# Altium footprint library Cty1.PcbLib: 1378 footprints (part 74 of 87)
Each footprint in its own frame and in the unit in brackets; x right, y up, seen from the top. Pads: shape width x height; smd on the part's side, far side on the other; paste and mask are expansions set on the pad; w line width, h text height; cw(c..) or ccw(c..) is an arc to the next point about the centre after c.
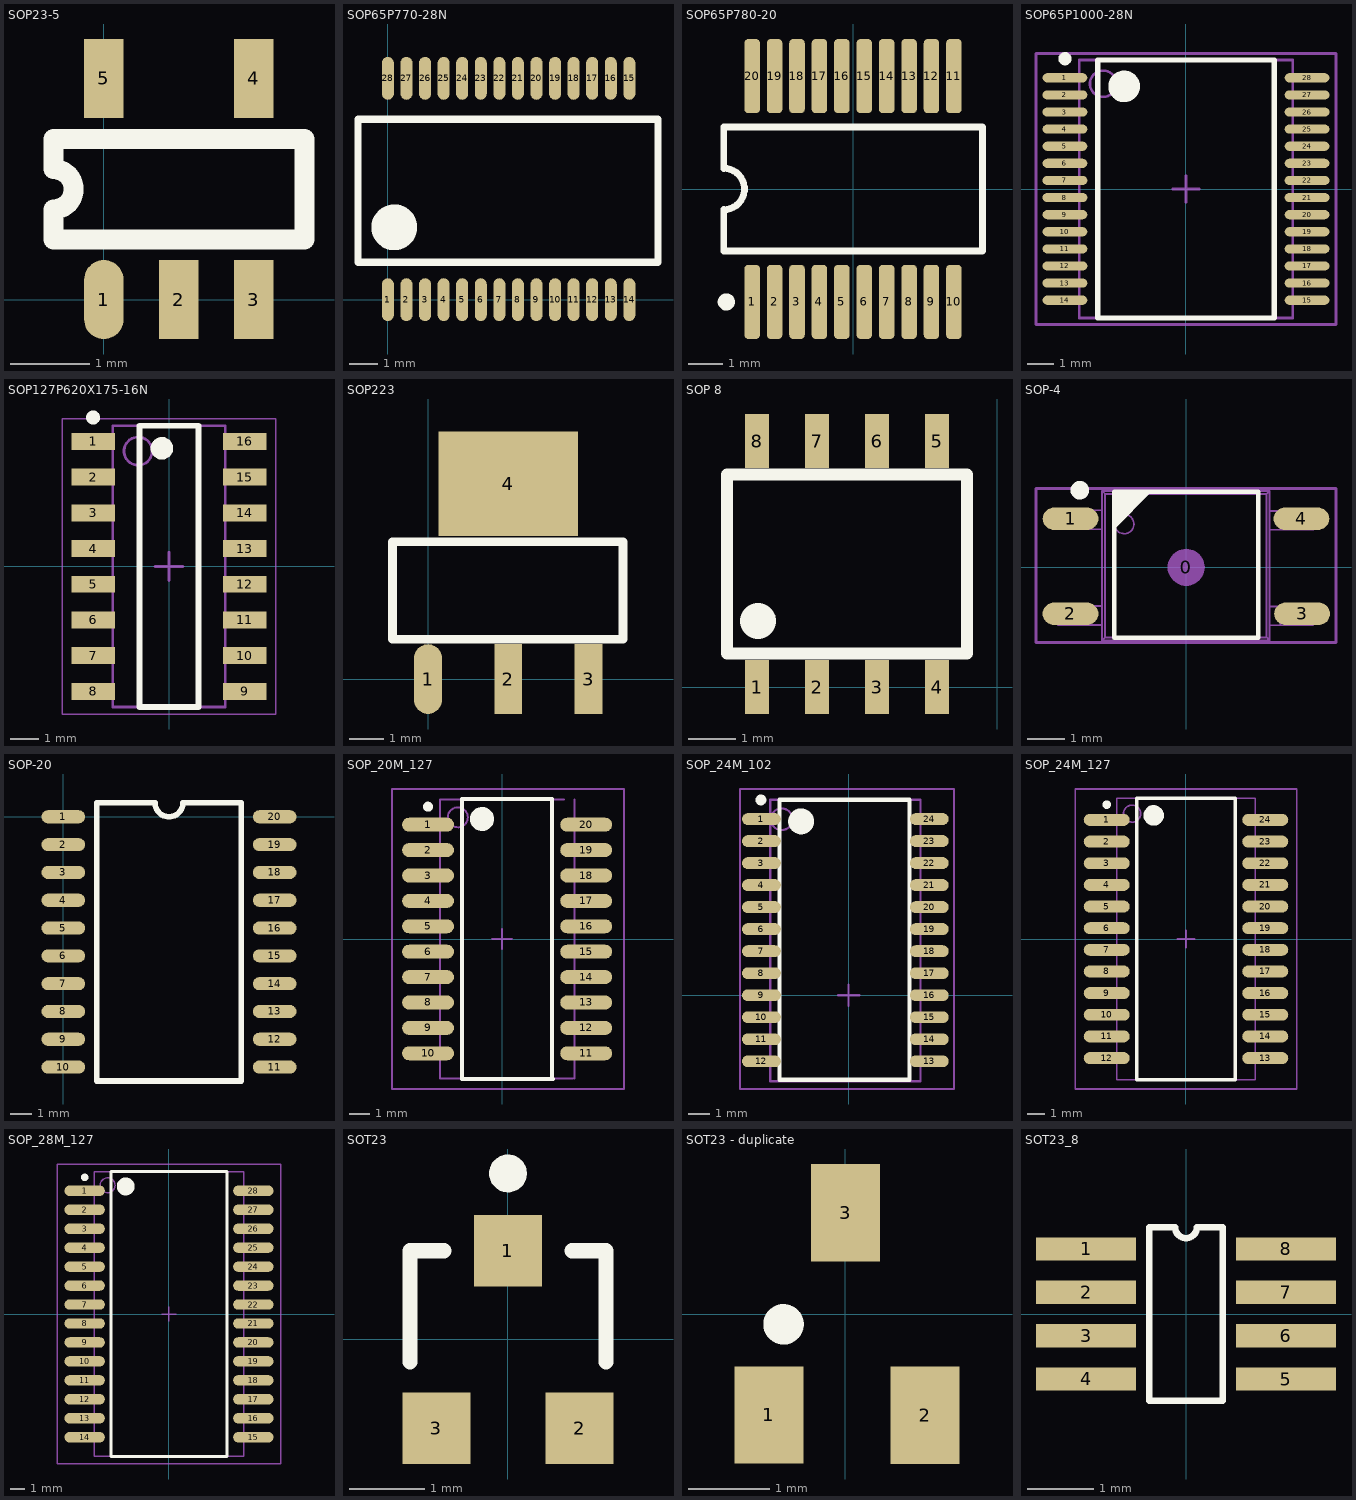
[diagram p73: the footprints below, top view; thin cyan lines are the x and y axes]

## SOP23-5 [mm]
pads (5):
  oval 0.5x1 smd: 1(0,0)
  rect 0.5x1 smd: 2(0.95,0) 3(1.9,0) 4(1.9,2.8) 5(0,2.8)
Top Overlay:
  lines w0.254: -0.635,0.762 2.54,0.762 2.54,2.032 -0.635,2.032 -0.635,1.651 cw(c-0.635,1.397) -0.635,1.143 -0.635,0.762

## SOP65P770-28N [mil]
pads (28):
  oval 16.53x59.03 smd mask+7.9: 1(0,0) 2(25.6,0) 3(51.18,0) 4(76.78,0) 5(102.37,0) 6(127.97,0) 7(153.57,0) 8(179.15,0) 9(204.75,0) 10(230.35,0) 11(255.93,0) 12(281.53,0) 13(307.12,0) 14(332.7,0) 15(332.7,305) 16(307.12,305) 17(281.53,305) 18(255.93,305) 19(230.35,305) 20(204.75,305) 21(179.15,305) 22(153.57,305) 23(127.97,305) 24(102.37,305) 25(76.78,305) 26(51.18,305) 27(25.6,305) 28(0,305)
Top Overlay:
  circle w39.37: c8.8,99.7 r11.88
  lines w10: -41.22,51.66 -41.22,248.53 372.21,248.53 372.21,51.66 -41.22,51.66
3D body "SOP65P770x200-28N.step": height 84.65, standoff 0, extent -37.01,0.01 369.69,305.35

## SOP65P780-20 [mm]
pads (20):
  rrect50% 0.45x2.15 smd: 1(-2.925,-3.275) 2(-2.275,-3.275) 3(-1.625,-3.275) 4(-0.975,-3.275) 5(-0.325,-3.275) 6(0.325,-3.275) 7(0.975,-3.275) 8(1.625,-3.275) 9(2.275,-3.275) 10(2.925,-3.275) 11(2.925,3.275) 12(2.275,3.275) 13(1.625,3.275) 14(0.975,3.275) 15(0.325,3.275) 16(-0.325,3.275) 17(-0.975,3.275) 18(-1.625,3.275) 19(-2.275,3.275) 20(-2.925,3.275)
Top Overlay:
  circle w0.25: c-3.675,-3.275 r0.125
  lines w0.2: -3.75,-1.8 -3.75,-0.6 ccw(c-3.75,0) -3.75,0.6 -3.75,1.8 3.75,1.8 3.75,-1.8 -3.75,-1.8
3D body: height 1, standoff 0, extent -3.278,-1.757 3.378,1.807
3D body: height 0.25, standoff 0.13, extent 2.849,1.894 3.027,2.631
3D body: height 0.13, standoff 0, extent 2.849,2.567 3.027,3.253
3D body: height 0.25, standoff 0.13, extent 2.189,1.919 2.367,2.656
3D body: height 0.13, standoff 0, extent 2.189,2.592 2.367,3.278
3D body: height 0.13, standoff 0, extent 2.85,-3.326 3.028,-2.641
3D body: height 0.25, standoff 0.13, extent 2.85,-2.679 3.028,-1.942
3D body: height 0.13, standoff 0, extent 2.215,-3.301 2.393,-2.615
3D body: height 0.25, standoff 0.13, extent 2.215,-2.679 2.393,-1.942
3D body: height 0.25, standoff 0.13, extent 1.478,1.843 1.656,2.58
3D body: height 0.13, standoff 0, extent 1.478,2.516 1.656,3.202
3D body: height 0.25, standoff 0.13, extent 0.843,1.843 1.021,2.58
3D body: height 0.13, standoff 0, extent 0.843,2.542 1.021,3.227
3D body: height 0.25, standoff 0.13, extent 0.182,1.869 0.36,2.605
3D body: height 0.13, standoff 0, extent 0.182,2.542 0.36,3.227
3D body: height 0.25, standoff 0.13, extent -0.478,1.894 -0.3,2.631
3D body: height 0.13, standoff 0, extent -0.478,2.567 -0.3,3.253
3D body: height 0.13, standoff 0, extent 1.529,-3.25 1.707,-2.564
3D body: height 0.25, standoff 0.13, extent 1.529,-2.628 1.707,-1.891
3D body: height 0.13, standoff 0, extent 0.869,-3.225 1.047,-2.539
3D body: height 0.25, standoff 0.13, extent 0.869,-2.602 1.047,-1.866
3D body: height 0.13, standoff 0, extent 0.209,-3.225 0.386,-2.539
3D body: height 0.25, standoff 0.13, extent 0.209,-2.577 0.386,-1.84
3D body: height 0.13, standoff 0, extent -0.426,-3.199 -0.249,-2.514
3D body: height 0.25, standoff 0.13, extent -0.426,-2.577 -0.249,-1.84
3D body: height 0.25, standoff 0.13, extent -2.966,-2.577 -2.789,-1.84
3D body: height 0.13, standoff 0, extent -2.966,-3.199 -2.789,-2.514
3D body: height 0.25, standoff 0.13, extent -2.331,-2.577 -2.154,-1.84
3D body: height 0.13, standoff 0, extent -2.331,-3.225 -2.154,-2.539
3D body: height 0.25, standoff 0.13, extent -1.671,-2.602 -1.493,-1.866
3D body: height 0.13, standoff 0, extent -1.671,-3.225 -1.493,-2.539
3D body: height 0.25, standoff 0.13, extent -1.011,-2.628 -0.833,-1.891
3D body: height 0.13, standoff 0, extent -1.011,-3.25 -0.833,-2.564
3D body: height 0.13, standoff 0, extent -3.018,2.567 -2.84,3.253
3D body: height 0.25, standoff 0.13, extent -3.018,1.894 -2.84,2.631
3D body: height 0.13, standoff 0, extent -2.358,2.542 -2.18,3.227
3D body: height 0.25, standoff 0.13, extent -2.358,1.869 -2.18,2.605
3D body: height 0.13, standoff 0, extent -1.697,2.542 -1.519,3.227
3D body: height 0.25, standoff 0.13, extent -1.697,1.843 -1.519,2.58
3D body: height 0.13, standoff 0, extent -1.062,2.516 -0.884,3.202
3D body: height 0.25, standoff 0.13, extent -1.062,1.843 -0.884,2.58
3D body: height 0.9, standoff 0, extent -3.327,-2.008 3.429,2.007

## SOP65P1000-28N [mm] "SOP, 28-Leads, Body 9.7x8mm, Pitch 0.65mm, IPC Medium Density"
height 2
pads (28):
  oval 1.7x0.35 smd: 1(-4.6,4.225) 2(-4.6,3.575) 3(-4.6,2.925) 4(-4.6,2.275) 5(-4.6,1.625) 6(-4.6,0.975) 7(-4.6,0.325) 8(-4.6,-0.325) 9(-4.6,-0.975) 10(-4.6,-1.625) 11(-4.6,-2.275) 12(-4.6,-2.925) 13(-4.6,-3.575) 14(-4.6,-4.225) 15(4.6,-4.225) 16(4.6,-3.575) 17(4.6,-2.925) 18(4.6,-2.275) 19(4.6,-1.625) 20(4.6,-0.975) 21(4.6,-0.325) 22(4.6,0.325) 23(4.6,0.975) 24(4.6,1.625) 25(4.6,2.275) 26(4.6,2.925) 27(4.6,3.575) 28(4.6,4.225)
Top Overlay:
  circle w0.6: c-2.35,3.9 r0.3
  circle w0.25: c-4.6,4.95 r0.125
  lines w0.2: -3.35,-4.9 3.35,-4.9 3.35,4.9 -3.35,4.9 -3.35,-4.9
Mechanical 13:
  circle w0.1: c-3.15,4 r0.5
  lines w0.1: -4.05,-4.9 4.05,-4.9 4.05,4.9 -4.05,4.9 -4.05,-4.9
Mechanical 15:
  lines w0.1: -0.5,0 0.5,0 ; 0,-0.5 0,0.5 ; -5.7,-5.15 5.7,-5.15 5.7,5.15 -5.7,5.15 -5.7,-5.15
3D body: height 2, standoff 0, extent -4.05,-4.9 4.05,4.9

## SOP127P620X175-16N [mm] "SOP, 16-Leads, Body 10.00x4.00mm, Pitch 1.27mm, IPC Medium Density"
height 1.75
pads (16):
  rect 1.55x0.6 smd: 1(-2.7,4.445) 2(-2.7,3.175) 3(-2.7,1.905) 4(-2.7,0.635) 5(-2.7,-0.635) 6(-2.7,-1.905) 7(-2.7,-3.175) 8(-2.7,-4.445) 9(2.7,-4.445) 10(2.7,-3.175) 11(2.7,-1.905) 12(2.7,-0.635) 13(2.7,0.635) 14(2.7,1.905) 15(2.7,3.175) 16(2.7,4.445)
Top Overlay:
  circle w0.4: c-0.25,4.2 r0.2
  circle w0.25: c-2.7,5.295 r0.125
  lines w0.2: -1.05,-5 1.05,-5 1.05,5 -1.05,5 -1.05,-5
Mechanical 13:
  circle w0.1: c-1.1,4.1 r0.5
  lines w0.1: -2,-5 2,-5 2,5 -2,5 -2,-5
Mechanical 15:
  lines w0.05: -3.8,-5.25 3.8,-5.25 3.8,5.25 -3.8,5.25 -3.8,-5.25
  lines w0.1: -0.5,0 0.5,0 ; 0,-0.5 0,0.5
3D body: height 1.75, standoff 0.25, extent -2,-5 2,5

## SOP223 [mm]
pads (4):
  oval 0.8x2 smd: 1(0,0)
  rect 0.8x2 smd: 2(2.3,0) 3(4.6,0)
  rect 4x3 smd: 4(2.3,5.6)
Top Overlay:
  lines w0.254: -1.016,1.143 -1.016,3.937 5.588,3.937 5.588,1.143 -1.016,1.143

## SOP 8 [mil]
pads (8):
  rect 20x45 smd: 1(-200,0) 2(-150,0) 3(-100,0) 4(-50,0) 5(-50,205) 6(-100,205) 7(-150,205) 8(-200,205)
Top Overlay:
  lines w10: -225,28 -25,28 -25,177 -225,177 -225,28
  lines w30: -199.03,55.09 cw(c-203.05,53.75) -199,55

## SOP-4 [mm] "SOP, 0.65mm pitch, 8 pin, Body 3.0x3.0x1.09mm LWH, IPC Medium Density"
height 1.09
pads (5):
  round 1 on Mech15: 0(-0.005,-0.005)
  oval 1.5x0.6 smd: 1(-3.112,1.301) 2(-3.116,-1.254) 3(3.112,-1.254) 4(3.093,1.301)
Top Overlay:
  circle w0.25: c-2.864,2.068 r0.125
  region: -1.938,2.025 -0.938,2.025 -1.938,1.025
  lines w0.127: -1.938,-1.901 1.935,-1.901 1.935,2.025 -1.938,2.025 -1.938,-1.901
Mechanical 13:
  circle w0.05: c-1.671,1.158 r0.26
  lines w0.05: -3.113,-1.536 -3.112,-1.051 ; -3.103,1.039 -3.102,1.524 ; -3.025,-1.555 -3.024,-1.055 ; -3.015,1.02 -3.014,1.521 ; -2.95,-1.543 -2.95,-1.069 ; -2.94,1.032 -2.94,1.507 ; -2.57,-1.549 -2.57,-1.059 ; -2.56,1.026 -2.56,1.516 ; -2.281,-1.555 -3.448,-1.555 -3.448,-1.047 -2.281,-1.047 ; -2.273,-1.975 2.234,-1.975 ; -2.271,1.02 -3.438,1.02 -3.438,1.528 -2.271,1.528 ; -2.271,2.046 -2.271,-1.972 ; -2.184,-1.894 -2.184,1.959 ; 2.132,1.962 -2.174,1.962 -2.261,2.05 2.237,2.05 ; 2.145,-1.888 -2.186,-1.888 -2.271,-1.973 ; 2.145,-1.877 2.232,-1.964 ; 2.151,-1.886 2.151,1.962 2.238,2.049 2.238,-1.977 ; 2.244,-1.564 3.411,-1.564 3.411,-1.056 2.244,-1.056 ; 2.259,1.005 3.426,1.005 3.426,1.513 2.259,1.513 ; 2.533,-1.552 2.533,-1.062 ; 2.548,1.017 2.548,1.506 ; 2.913,-1.543 2.913,-1.068 ; 2.928,1.026 2.928,1.501 ; 2.986,-1.557 2.988,-1.056 ; 3.001,1.012 3.003,1.513 ; 3.074,-1.56 3.076,-1.075 ; 3.089,1.009 3.091,1.493 ; -2.271,-1.972 -2.271,-1.973
Mechanical 15:
  lines w0.076: -4.043,-2.024 -4.043,2.113 4.023,2.113 4.023,-2.024 -4.043,-2.024
3D body "SOP-4.step": height 2.06, standoff 0.01, extent -3.396,-1.978 3.464,2.022

## SOP-20 [mm]
pads (20):
  oval 2x0.6 smd: 1(0,0) 2(0,-1.27) 3(0,-2.54) 4(0,-3.81) 5(0,-5.08) 6(0,-6.35) 7(0,-7.62) 8(0,-8.89) 9(0,-10.16) 10(0,-11.43) 11(9.652,-11.43) 12(9.652,-10.16) 13(9.652,-8.89) 14(9.652,-7.62) 15(9.652,-6.35) 16(9.652,-5.08) 17(9.652,-3.81) 18(9.652,-2.54) 19(9.652,-1.27) 20(9.652,0)
Top Overlay:
  lines w0.254: 1.524,-12.065 1.524,0.635 4.191,0.635 ccw(c4.826,0.635) 5.461,0.635 8.128,0.635 8.128,-12.065 1.524,-12.065

## SOP_20M_127 [mm] "SOP, 20-Leads, Body 13.4x6.2mm, Pitch 1.27mm, IPC Low Density"
height 2
pads (20):
  oval 2.6x0.7 smd: 1(-3.7,5.715) 2(-3.7,4.445) 3(-3.7,3.175) 4(-3.7,1.905) 5(-3.7,0.635) 6(-3.7,-0.635) 7(-3.7,-1.905) 8(-3.7,-3.175) 9(-3.7,-4.445) 10(-3.7,-5.715) 11(4.208,-5.715) 12(4.208,-4.445) 13(4.208,-3.175) 14(4.208,-1.905) 15(4.208,-0.635) 16(4.208,0.635) 17(4.208,1.905) 18(4.208,3.175) 19(4.208,4.445) 20(4.208,5.715)
Top Overlay:
  circle w0.25: c-3.7,6.615 r0.125
  circle w0.6: c-1,6 r0.3
  lines w0.2: 2.413,7 -2,7 -2,-7 2.54,-7 ; 2.508,-7 2.508,7
Mechanical 13:
  circle w0.1: c-2.21,6.085 r0.5
  lines w0.1: 3.11,6.985 -3.11,6.985 -3.11,-6.985 3.556,-6.985 ; 3.618,-6.985 3.618,6.985
Mechanical 15:
  lines w0.1: -0.5,0 0.5,0 ; 0,-0.5 0,0.5 ; -5.5,-7.5 -5.5,7.5 6.096,7.5 6.096,-7.5 -5.5,-7.5
3D body: height 2, standoff 0, extent -3.11,-6.985 3.556,6.985

## SOP_24M_102 [mm] "24-Pin Small Outline Package 1.02 mm Pitch"
height 2.64
pads (24):
  oval 1.8x0.55 smd: 1(-4.039,8.16) 2(-4.039,7.14) 3(-4.039,6.12) 4(-4.039,5.1) 5(-4.039,4.08) 6(-4.039,3.06) 7(-4.039,2.04) 8(-4.039,1.02) 9(-4.039,0) 10(-4.039,-1.02) 11(-4.039,-2.04) 12(-4.039,-3.06) 13(3.734,-3.06) 14(3.734,-2.04) 15(3.734,-1.02) 16(3.734,0) 17(3.734,1.02) 18(3.734,2.04) 19(3.734,3.06) 20(3.734,4.08) 21(3.734,5.1) 22(3.734,6.12) 23(3.734,7.14) 24(3.734,8.16)
Top Overlay:
  circle w0.6: c-2.2,8.05 r0.3
  circle w0.25: c-4.062,9.042 r0.125
  lines w0.2: -3.2,-3.912 2.819,-3.912 2.819,9.05 -3.2,9.05 -3.2,-3.912
Mechanical 13:
  circle w0.1: c-3.1,8.15 r0.5
  lines w0.1: -3.632,-3.988 3.327,-3.988 3.327,9.05 -3.632,9.05 -3.632,-3.988
Mechanical 15:
  lines w0.1: -0.5,0 0.5,0 ; 0,-0.5 0,0.5 ; -5.029,-4.343 4.877,-4.343 4.877,9.55 -5.029,9.55 -5.029,-4.343
3D body: height 2.64, standoff 0, extent -3.632,-3.937 3.353,9.05

## SOP_24M_127 [mm] "SOP, 24-Leads, Body 15.6x8.1mm, Pitch 1.27mm, IPC Low Density"
height 2.5
pads (24):
  oval 2.7x0.7 smd: 1(-4.65,6.985) 2(-4.65,5.715) 3(-4.65,4.445) 4(-4.65,3.175) 5(-4.65,1.905) 6(-4.65,0.635) 7(-4.65,-0.635) 8(-4.65,-1.905) 9(-4.65,-3.175) 10(-4.65,-4.445) 11(-4.65,-5.715) 12(-4.65,-6.985) 13(4.65,-6.985) 14(4.65,-5.715) 15(4.65,-4.445) 16(4.65,-3.175) 17(4.65,-1.905) 18(4.65,-0.635) 19(4.65,0.635) 20(4.65,1.905) 21(4.65,3.175) 22(4.65,4.445) 23(4.65,5.715) 24(4.65,6.985)
Top Overlay:
  circle w0.6: c-1.9,7.25 r0.3
  circle w0.25: c-4.65,7.885 r0.125
  lines w0.2: -2.9,-8.25 2.9,-8.25 2.9,8.25 -2.9,8.25 -2.9,-8.25
Mechanical 13:
  circle w0.1: c-3.165,7.355 r0.5
  lines w0.1: -4.065,-8.255 4.065,-8.255 4.065,8.255 -4.065,8.255 -4.065,-8.255
Mechanical 15:
  lines w0.1: -0.5,0 0.5,0 ; 0,-0.5 0,0.5 ; -6.5,-8.8 6.5,-8.8 6.5,8.8 -6.5,8.8 -6.5,-8.8
3D body: height 2.79, standoff 2.54, extent -0.533,7.188 0.61,7.696
3D body: height 2.79, standoff 0.25, extent -2.649,6.324 -1.785,7.111
3D body "SW3dPS-24 pin soic.STEP": height 2.7, standoff -0.11, extent -4.949,-7.853 5.051,7.747

## SOP_28M_127 [mm] "SOP, 28-Leads, Body 18.1x8.6mm, Pitch 1.27mm, IPC Low Density"
height 3.05
pads (28):
  oval 2.7x0.7 smd: 1(-5.65,8.255) 2(-5.65,6.985) 3(-5.65,5.715) 4(-5.65,4.445) 5(-5.65,3.175) 6(-5.65,1.905) 7(-5.65,0.635) 8(-5.65,-0.635) 9(-5.65,-1.905) 10(-5.65,-3.175) 11(-5.65,-4.445) 12(-5.65,-5.715) 13(-5.65,-6.985) 14(-5.65,-8.255) 15(5.65,-8.255) 16(5.65,-6.985) 17(5.65,-5.715) 18(5.65,-4.445) 19(5.65,-3.175) 20(5.65,-1.905) 21(5.65,-0.635) 22(5.65,0.635) 23(5.65,1.905) 24(5.65,3.175) 25(5.65,4.445) 26(5.65,5.715) 27(5.65,6.985) 28(5.65,8.255)
Top Overlay:
  circle w0.25: c-5.65,9.155 r0.125
  circle w0.6: c-2.9,8.55 r0.3
  lines w0.2: -3.9,-9.55 -3.9,9.55 3.9,9.55 3.9,-9.55 -3.9,-9.55
Mechanical 13:
  circle w0.1: c-4.115,8.625 r0.5
  lines w0.1: -5.015,-9.525 -5.015,9.525 5.015,9.525 5.015,-9.525 -5.015,-9.525
Mechanical 15:
  lines w0.1: -0.5,0 0.5,0 ; 0,-0.5 0,0.5 ; -7.5,-10.05 -7.5,10.05 7.5,10.05 7.5,-10.05 -7.5,-10.05
3D body "SO28.STEP": height 2.64, standoff 0, extent -5.336,-9.04 5.334,9.04

## SOT23 [mm] "SOT-23; 3 Leads; Body 3.1 x 2.5 mm, inc. leads (LxW max), Alternate Lead Configuration"
height 1.1
pads (3):
  rect 0.9x0.95 smd: 1(0,1.175) 2(0.95,-1.175) 3(-0.95,-1.175)
Top Overlay:
  circle w0.25: c0,2.2 r0.125
  lines w0.2: -1.3,-0.3 -1.3,1.175 -0.85,1.175 ; 0.85,1.175 1.3,1.175 1.3,-0.3

## SOT23 - duplicate [mm] "SOT 23 _ 1-3-2"
height 1.27
pads (3):
  rect 0.85x1.2 smd: 1(-0.94,-1.245) 2(0.985,-1.25) 3(0.005,1.25)
Top Overlay:
  circle w0.25: c-0.76,-0.127 r0.125
3D body "SW3DPS-SOT-23-DEFAULT.STEP": height 1.06, standoff -0.04, extent -1.475,-1.326 1.525,1.174

## SOT23_8 [mm]
pads (8):
  rect 1.5x0.35 smd: 1(-1.5,0.975) 2(-1.5,0.325) 3(-1.5,-0.325) 4(-1.5,-0.975) 5(1.5,-0.975) 6(1.5,-0.325) 7(1.5,0.325) 8(1.5,0.975)
Top Overlay:
  lines w0.1: -0.553,-1.3 0.553,-1.3 0.553,1.3 0.162,1.3 cw(c0,1.3) -0.162,1.3 -0.553,1.3 -0.553,-1.3